# Altium footprint library STM32F405.PcbLib: 36 footprints (part 3 of 3)
Each footprint in its own frame and in the unit in brackets; x right, y up, seen from the top. Pads: shape width x height; smd on the part's side, far side on the other; paste and mask are expansions set on the pad; w line width, h text height; cw(c..) or ccw(c..) is an arc to the next point about the centre after c.
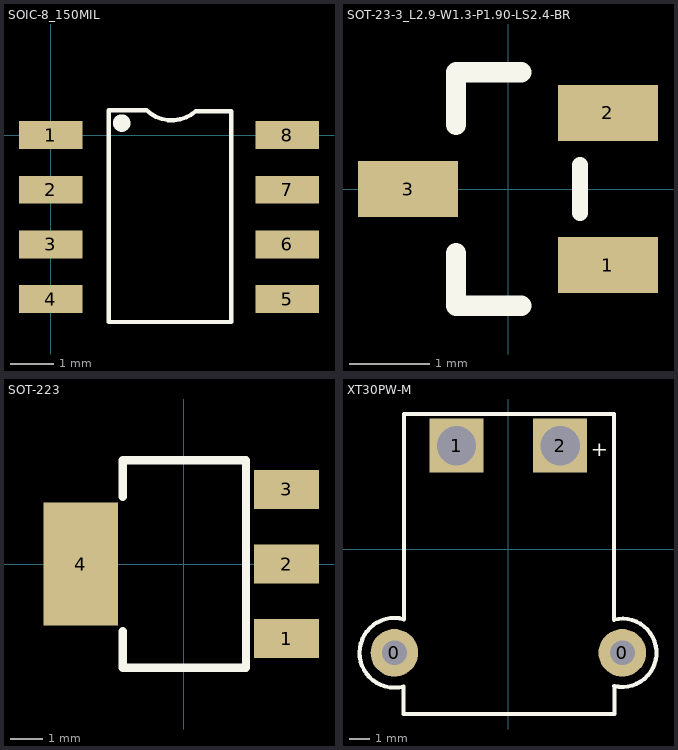
[diagram p2: the footprints below, top view; thin cyan lines are the x and y axes]

## SOIC-8_150MIL [mm]
pads (8):
  rect 1.473x0.65 smd: 1(0,0) 2(0,-1.27) 3(0,-2.54) 4(0,-3.81) 5(5.5,-3.81) 6(5.5,-2.54) 7(5.5,-1.27) 8(5.5,0)
Top Overlay:
  circle w0.305: c1.65,0.28 r0.05
  lines w0.1: 2.2,0.58 1.35,0.58 1.35,-4.345 4.2,-4.345 4.2,0.555 3.4,0.555 ; 2.225,0.58 ccw(c2.812,1.193) 3.374,0.557
3D body "SO-8.STEP": height 1.7, standoff 0, extent -0.3,-4.345 5.7,0.555

## SOT-23-3_L2.9-W1.3-P1.90-LS2.4-BR [mm]
pads (3):
  rect 1.25x0.7 smd: 1(1.25,-0.95) 2(1.25,0.95) 3(-1.25,0)
Top Overlay:
  lines w0.2: 0.9,-0.3 0.9,0.3
  lines w0.254: -0.65,-0.8 -0.65,-1.46 0.165,-1.46 ; 0.165,1.46 -0.65,1.46 ; -0.65,0.8 -0.65,1.46 ; -0.65,0.8 -0.65,1.46 ; -0.65,0.8 -0.65,1.46
3D body "SOT23-3.STEP": height 1.05, standoff 0, extent -0.972,-1.5 1.428,1.5

## SOT-223 [mm]
pads (4):
  rect 2x1.2 smd: 1(3.175,-2.3) 2(3.175,0) 3(3.175,2.3)
  rect 2.3x3.8 smd: 4(-3.175,0)
Top Overlay:
  lines w0.254: -1.875,-2.075 -1.875,-3.2 1.925,-3.2 1.925,3.2 -1.875,3.2 -1.875,2.075
3D body "CircuitWorks-SOT-223.STEP": height 1.66, standoff -0.02, extent -3.302,-3.302 3.658,3.198

## XT30PW-M [mm]
pads (4):
  round 2.3 hole 1.2: 0(-5.5,-5) 0(5.5,-5)
  rect 2.6x2.6 hole 1.9: 1(-2.5,5) 2(2.5,5)
Top Overlay:
  lines w0.2: 5.109,-6.601 ccw(c5.5,-5) 5.093,-3.403 5.093,1.444 5.093,6.524 -5.04,6.524 -5.04,1.571 -5.04,-3.382 ccw(c-5.5,-5) -5.057,-6.623 -5.057,-7.954 5.12,-7.954 5.12,-6.601
  text "+" at 3.977,4.238 h1.27
3D body "User Library-XT30PW-M.STEP": height 5, standoff -2, extent -6.673,-7.945 6.627,6.005